# Altium footprint library 集大电协1.5.PcbLib: 283 footprints (part 6 of 18)
Each footprint in its own frame and in the unit in brackets; x right, y up, seen from the top. Pads: shape width x height; smd on the part's side, far side on the other; paste and mask are expansions set on the pad; w line width, h text height; cw(c..) or ccw(c..) is an arc to the next point about the centre after c.
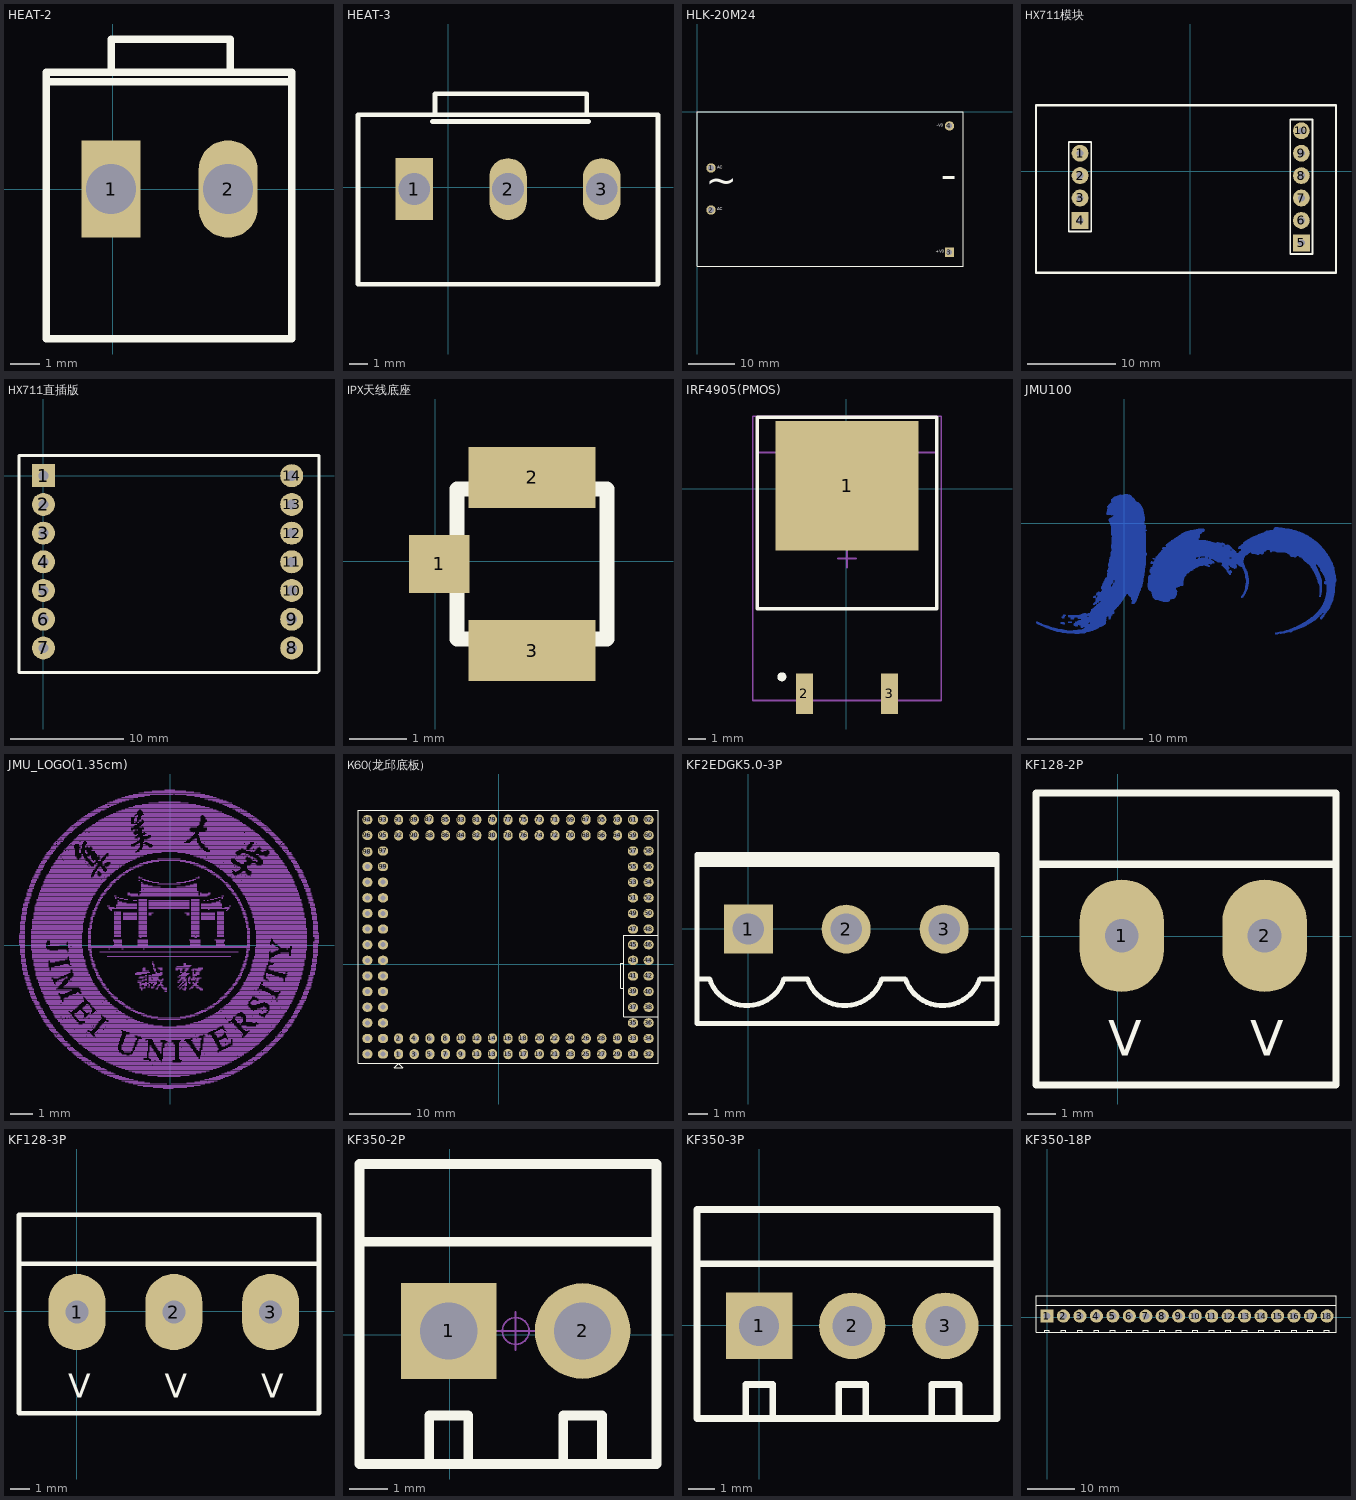
[diagram p5: the footprints below, top view; thin cyan lines are the x and y axes]

## HEAT-2 [mm]
pads (2):
  rect 2x3.3 hole 1.7: 1(-0.051,0.007)
  oval 2x3.3 hole 1.7: 2(3.909,0.007)
Top Overlay:
  lines w0.254: -2.251,3.639 6.069,3.639 ; -0.051,3.967 -0.051,5.087 3.988,5.087 3.988,3.967 ; -2.251,-5.073 -2.251,3.967 6.069,3.967 6.069,-5.073 -2.251,-5.073
3D body "molex-22-27-2021.STEP": height 11.68, standoff -3.56, extent -0.47,-3.57 4.61,2.78

## HEAT-3 [mm]
pads (3):
  rect 2x3.3 hole 1.7: 1(-1.8,-0.1)
  oval 2x3.3 hole 1.7: 2(3.2,-0.1) 3(8.2,-0.1)
Top Overlay:
  lines w0.254: -0.82,3.5 7.5,3.5 ; -0.7,3.867 -0.7,4.987 2.359,4.987 4.378,4.987 7.4,4.987 7.4,3.867 ; -4.8,-5.173 11.2,-5.173 11.2,3.867 -4.8,3.867 -4.8,-5.173
3D body "molex-22-27-2031.STEP": height 11.68, standoff -3.56, extent -0.457,-3.734 7.163,2.616

## HLK-20M24 [mm] "HILINK 24V隔离电源模块"
pads (4):
  round 2 hole 1.2: 1(3,-12) 2(3,-21) 4(54,-3)
  rect 2x2 hole 1.2: 3(54,-30)
Top Overlay:
  lines w0.1: 0,-33 0,0 57,0 57,-33 0,-33
  text "-V0" at 51.317,-3.4 h1.02
  text "+V0" at 51.075,-30.4 h1.02
  text "AC" at 4.375,-21.275 h1.02
  text "AC" at 4.375,-12.35 h1.02
  text "~" at 1.925,-19.35 h10
  text "-" at 52.175,-18.856 h12
3D body "20M4_3.step": height 22.6, standoff -6, extent 0,-33 57,0

## HX711模块 [mil]
pads (10):
  round 75 hole 30: 1(-492.49,81.19) 2(-492.49,-18.81) 3(-492.49,-118.81) 6(495.26,-219) 7(495.26,-119) 8(495.26,-19) 9(495.26,81) 10(495.26,181)
  rect 75x75 hole 30: 4(-492.49,-218.81) 5(495.26,-319)
Top Overlay:
  lines w7.87: -542.49,-268.81 -542.49,131.19 -442.49,131.19 -442.49,-268.81 -542.49,-268.81 ; 445.26,-369 445.26,231 545.26,231 545.26,-369 445.26,-369
  lines w10: -688.98,-452.76 -688.98,295.28 649.61,295.28 649.61,-452.76 -688.98,-452.76
3D body: height 340, standoff 300, extent -669.29,-433.07 629.92,275.59
3D body: height 336.22, standoff -118.11, extent -540.94,-262.99 -440.94,137.01
3D body: height 336.22, standoff -118.11, extent 445.26,-368.99 545.26,231.01

## HX711直插版 [mil]
pads (14):
  rect 80x80 hole 35.43: 1(0,0)
  round 80 hole 35.43: 2(0,-100) 3(0,-200) 4(0,-300) 5(0,-400) 6(0,-500) 7(0,-600) 8(865,-600) 9(865,-500) 10(865,-400) 11(865,-300) 12(865,-200) 13(865,-100) 14(865,0)
Top Overlay:
  lines w10: -85,-685 955,-685 960,-680 960,70 -85,70 -85,-685
Bottom Overlay:
  lines w7.87: -50,-650 -50,50 50,50 50,-650 -50,-650 ; 815,-650 915,-650 915,50 815,50 815,-650

## IPX天线底座 [mm]
pads (3):
  rect 1.05x1 smd: 1(0.073,-0.048)
  rect 2.2x1.05 smd: 2(1.681,1.452) 3(1.681,-1.548)
Top Overlay:
  lines w0.254: 0.381,-1.348 0.381,1.252 2.981,1.252 2.981,-1.348 0.381,-1.348
3D body "User Library-1909763-1.STEP": height 1.3, standoff 0.02, extent 0.149,-1.574 2.999,1.426

## IRF4905(PMOS) [mm] "IRF4905"
pads (3):
  rect 8x7.2 smd: 1(0.047,0.174)
  rect 0.95x2.25 smd: 2(-2.333,-11.426) 3(2.427,-11.426)
Top Overlay:
  circle w0.25: c-3.585,-10.478 r0.125
  lines w0.2: -4.953,-6.676 -4.953,3.998 5.047,3.998 5.047,-6.676 -4.953,-6.676
Mechanical 13:
  lines w0.1: -4.953,-6.676 5.047,-6.676 5.047,2.024 -4.953,2.024 -4.953,-6.676
Mechanical 15:
  lines w0.1: -0.453,-3.876 0.547,-3.876 ; 0.047,-4.376 0.047,-3.376 ; -5.203,-11.801 5.297,-11.801 5.297,4.049 -5.203,4.049 -5.203,-11.801
3D body "User Library-DPAK-1.STEP": height 2.39, standoff -0.02, extent -3.323,-10.459 3.217,-0.52

## JMU100 [mm]
Bottom Layer:
  lines w0.043: -7.654,-8.545 -7.395,-8.545 ; -7.654,-8.502 -7.481,-8.502 ; -7.611,-8.588 -7.309,-8.588 ; -7.525,-8.631 -7.179,-8.631 ; -7.481,-8.675 -7.136,-8.675 ; -7.395,-8.718 -7.05,-8.718 ; -7.266,-8.761 -6.92,-8.761 ; -7.179,-8.804 -6.747,-8.804 ; -7.05,-8.847 -6.575,-8.847 ; -6.963,-8.89 -6.488,-8.89 ; -6.877,-8.934 -6.402,-8.934 ; -6.791,-8.977 -6.272,-8.977 ; -6.704,-9.02 -6.056,-9.02 ; -6.531,-9.063 -5.884,-9.063 ; -6.445,-9.106 -5.754,-9.106 ; -6.359,-9.15 -5.366,-9.15 ; -6.186,-9.193 -5.193,-9.193 ; -6.1,-9.236 -4.977,-9.236 ; -5.927,-9.279 -2.904,-9.279 ; -5.841,-9.322 -3.034,-9.322 ; -5.495,-9.365 -3.293,-9.365 ; -5.495,-8.631 -5.15,-8.631 ; -5.495,-8.588 -5.15,-8.588 ; -5.495,-8.545 -5.236,-8.545 ; -5.409,-8.113 -5.193,-8.113 ; -5.409,-8.07 -5.193,-8.07 ; -5.366,-9.409 -3.336,-9.409 ; -5.366,-8.156 -5.193,-8.156 ; -5.322,-8.675 -5.15,-8.675 ; -5.322,-8.027 -5.15,-8.027 ; -5.322,-7.984 -5.15,-7.984 ; -5.279,-7.94 -5.063,-7.94 ; -5.279,-7.897 -5.107,-7.897 ; -4.977,-9.452 -3.422,-9.452 ; -4.847,-8.545 -4.545,-8.545 ; -4.847,-8.502 -4.545,-8.502 ; -4.847,-8.027 -3.207,-8.027 ; -4.847,-7.984 -3.207,-7.984 ; -4.847,-7.94 -1.134,-7.94 ; -4.804,-8.07 -3.207,-8.07 ; -4.632,-8.243 -4.372,-8.243 ; -4.632,-8.2 -4.372,-8.2 ; -4.632,-8.156 -4.329,-8.156 ; -4.632,-8.113 -4.329,-8.113 ; -4.416,-9.236 -2.732,-9.236 ; -4.372,-8.761 -4.027,-8.761 ; -4.372,-8.718 -1.695,-8.718 ; -4.372,-8.675 -3.12,-8.675 ; -4.329,-8.804 -4.027,-8.804 ; -4.329,-8.631 -3.12,-8.631 ; -4.286,-9.495 -3.897,-9.495 ; -4.243,-8.847 -4.027,-8.847 ; -4.243,-8.588 -3.12,-8.588 ; -4.243,-8.545 -3.077,-8.545 ; -4.243,-8.502 -1.609,-8.502 ; -4.07,-8.459 -1.609,-8.459 ; -4.027,-9.193 -2.645,-9.193 ; -4.027,-8.415 -1.609,-8.415 ; -4.027,-8.156 -1.566,-8.156 ; -4.027,-8.113 -1.566,-8.113 ; -3.984,-8.2 -1.566,-8.2 ; -3.941,-8.372 -1.566,-8.372 ; -3.897,-8.761 -1.782,-8.761 ; -3.854,-7.897 -1.048,-7.897 ; -3.768,-8.934 -3.552,-8.934 ; -3.768,-8.89 -1.998,-8.89 ; -3.768,-8.847 -1.911,-8.847 ; -3.768,-8.804 -1.825,-8.804 ; -3.725,-8.977 -3.595,-8.977 ; -3.725,-8.329 -1.566,-8.329 ; -3.725,-8.286 -1.609,-8.286 ; -3.725,-8.243 -1.609,-8.243 ; -3.725,-7.854 -1.048,-7.854 ; -3.638,-9.15 -2.516,-9.15 ; -3.638,-7.811 -1.048,-7.811 ; -3.552,-9.106 -2.429,-9.106 ; -3.509,-7.768 -3.336,-7.768 ; -3.466,-9.063 -2.343,-9.063 ; -3.422,-9.02 -2.257,-9.02 ; -3.422,-8.977 -2.213,-8.977 ; -3.422,-8.934 -2.17,-8.934 ; -3.12,-7.768 -0.918,-7.768 ; -3.077,-8.07 -1.566,-8.07 ; -3.077,-8.027 -1.523,-8.027 ; -3.077,-7.984 -1.134,-7.984 ; -2.991,-8.675 -1.652,-8.675 ; -2.948,-8.631 -1.609,-8.631 ; -2.948,-8.588 -1.609,-8.588 ; -2.948,-8.545 -1.609,-8.545 ; -2.948,-7.725 -0.875,-7.725 ; -2.948,-7.681 -0.875,-7.681 ; -2.904,-7.638 -0.875,-7.638 ; -2.904,-7.595 -0.918,-7.595 ; -2.861,-7.552 -0.918,-7.552 ; -2.861,-7.509 -0.918,-7.509 ; -2.861,-7.465 -0.875,-7.465 ; -2.861,-7.422 -0.832,-7.422 ; -2.775,-7.379 -0.789,-7.379 ; -2.688,-7.336 -0.745,-7.336 ; -2.688,-6.991 -2.559,-6.991 ; -2.688,-6.947 -2.516,-6.947 ; -2.688,-6.386 -2.473,-6.386 ; -2.688,-6.343 -2.473,-6.343 ; -2.645,-7.293 -0.702,-7.293 ; -2.645,-6.904 -2.386,-6.904 ; -2.645,-6.3 -2.473,-6.3 ; -2.602,-7.25 -0.659,-7.25 ; -2.602,-6.861 -2.386,-6.861 ; -2.559,-7.206 -0.659,-7.206 ; -2.559,-6.818 -2.343,-6.818 ; -2.559,-6.256 -2.473,-6.256 ; -2.516,-7.163 -0.573,-7.163 ; -2.516,-6.775 -2.213,-6.775 ; -2.473,-6.731 -2.213,-6.731 ; -2.473,-6.688 -2.17,-6.688 ; -2.473,-6.645 -0.184,-6.645 ; -2.473,-6.602 -0.141,-6.602 ; -2.473,-6.559 -0.141,-6.559 ; -2.473,-6.516 -0.098,-6.516 ; -2.473,-6.472 -0.098,-6.472 ; -2.473,-6.429 -0.054,-6.429 ; -2.429,-7.12 -0.529,-7.12 ; -2.429,-7.077 -0.486,-7.077 ; -2.429,-6.17 0.118,-6.17 ; -2.429,-6.127 0.161,-6.127 ; -2.429,-6.084 0.161,-6.084 ; -2.386,-7.034 -0.486,-7.034 ; -2.386,-6.991 -0.443,-6.991 ; -2.386,-6.041 1.241,-6.041 ; -2.386,-5.997 1.284,-5.997 ; -2.343,-6.386 -0.011,-6.386 ; -2.343,-6.343 -0.011,-6.343 ; -2.3,-6.3 0.032,-6.3 ; -2.3,-6.256 0.075,-6.256 ; -2.3,-6.213 0.118,-6.213 ; -2.3,-5.954 1.284,-5.954 ; -2.257,-6.947 -0.4,-6.947 ; -2.257,-5.911 -2.17,-5.911 ; -2.213,-6.904 -0.357,-6.904 ; -2.213,-6.861 -0.314,-6.861 ; -2.084,-6.818 -0.314,-6.818 ; -2.041,-6.775 -0.27,-6.775 ; -2.041,-6.731 -0.227,-6.731 ; -2.041,-6.688 -0.227,-6.688 ; -1.998,-5.911 1.327,-5.911 ; -1.998,-5.868 1.327,-5.868 ; -1.998,-5.609 1.414,-5.609 ; -1.998,-5.566 1.414,-5.566 ; -1.998,-5.522 1.457,-5.522 ; -1.998,-5.479 1.5,-5.479 ; -1.954,-5.825 1.327,-5.825 ; -1.954,-5.652 1.414,-5.652 ; -1.954,-5.436 -1.177,-5.436 ; -1.911,-5.781 1.37,-5.781 ; -1.911,-5.738 1.414,-5.738 ; -1.911,-5.695 1.414,-5.695 ; -1.911,-5.393 -1.177,-5.393 ; -1.911,-5.35 -1.177,-5.35 ; -1.911,-5.306 -1.177,-5.306 ; -1.868,-5.263 -1.134,-5.263 ; -1.868,-5.22 -1.134,-5.22 ; -1.868,-5.177 -1.091,-5.177 ; -1.825,-5.134 -0.961,-5.134 ; -1.782,-5.091 -0.961,-5.091 ; -1.782,-5.047 -0.961,-5.047 ; -1.782,-5.004 -0.961,-5.004 ; -1.738,-4.961 -0.961,-4.961 ; -1.695,-4.918 -0.961,-4.918 ; -1.695,-4.875 -0.961,-4.875 ; -1.695,-4.832 1.63,-4.832 ; -1.652,-4.788 1.63,-4.788 ; -1.652,-4.745 1.63,-4.745 ; -1.609,-4.702 1.63,-4.702 ; -1.566,0.825 1.673,0.825 ; -1.523,-4.659 1.673,-4.659 ; -1.523,0.868 1.673,0.868 ; -1.523,0.911 1.673,0.911 ; -1.523,0.955 1.673,0.955 ; -1.523,0.998 1.673,0.998 ; -1.479,-4.616 1.673,-4.616 ; -1.479,-4.572 1.673,-4.572 ; -1.479,-4.529 1.673,-4.529 ; -1.479,-4.486 1.716,-4.486 ; -1.479,-4.443 1.716,-4.443 ; -1.479,-4.4 1.716,-4.4 ; -1.479,-4.357 1.716,-4.357 ; -1.479,-4.313 1.716,-4.313 ; -1.479,-4.141 1.759,-4.141 ; -1.479,-4.097 1.759,-4.097 ; -1.479,-4.054 1.759,-4.054 ; -1.479,0.782 1.716,0.782 ; -1.479,1.041 1.63,1.041 ; -1.479,1.084 1.63,1.084 ; -1.479,1.127 1.63,1.127 ; -1.479,1.171 1.63,1.171 ; -1.479,1.214 1.63,1.214 ; -1.479,1.43 1.5,1.43 ; -1.479,1.473 1.5,1.473 ; -1.436,-4.27 1.716,-4.27 ; -1.436,-4.227 1.716,-4.227 ; -1.436,-4.184 1.759,-4.184 ; -1.436,-4.011 1.759,-4.011 ; -1.436,1.257 1.586,1.257 ; -1.436,1.3 1.586,1.3 ; -1.436,1.343 1.543,1.343 ; -1.436,1.386 1.543,1.386 ; -1.393,-3.968 1.759,-3.968 ; -1.393,-3.925 1.759,-3.925 ; -1.393,-3.882 1.759,-3.882 ; -1.393,-3.666 1.802,-3.666 ; -1.393,-3.622 1.802,-3.622 ; -1.393,-3.579 1.845,-3.579 ; -1.393,-3.536 1.845,-3.536 ; -1.393,-3.493 1.845,-3.493 ; -1.393,1.516 1.457,1.516 ; -1.393,1.559 1.414,1.559 ; -1.35,-8.243 -1.22,-8.243 ; -1.35,-8.2 -1.22,-8.2 ; -1.35,-8.156 -1.177,-8.156 ; -1.35,-8.113 -1.177,-8.113 ; -1.35,-8.07 -1.177,-8.07 ; -1.35,-8.027 -1.177,-8.027 ; -1.35,-3.838 1.759,-3.838 ; -1.35,-3.795 1.802,-3.795 ; -1.35,-3.752 1.802,-3.752 ; -1.35,-3.709 1.802,-3.709 ; -1.35,-3.45 1.845,-3.45 ; -1.35,-3.407 1.845,-3.407 ; -1.35,0.264 1.759,0.264 ; -1.35,0.307 1.759,0.307 ; -1.35,0.35 1.759,0.35 ; -1.35,1.602 1.414,1.602 ; -1.307,-3.363 1.845,-3.363 ; -1.307,-3.32 1.845,-3.32 ; -1.307,-3.277 1.845,-3.277 ; -1.307,-3.234 1.845,-3.234 ; -1.307,-3.191 1.845,-3.191 ; -1.307,-3.147 1.845,-3.147 ; -1.307,-3.104 1.845,-3.104 ; -1.307,0.177 1.716,0.177 ; -1.307,0.221 1.716,0.221 ; -1.307,0.393 1.759,0.393 ; -1.307,1.645 1.37,1.645 ; -1.263,-3.061 1.845,-3.061 ; -1.263,-3.018 1.845,-3.018 ; -1.263,-2.975 1.845,-2.975 ; -1.263,-2.932 1.845,-2.932 ; -1.263,0.091 1.716,0.091 ; -1.263,0.134 1.716,0.134 ; -1.263,0.436 1.759,0.436 ; -1.263,1.689 1.327,1.689 ; -1.22,-2.888 1.845,-2.888 ; -1.22,-0.039 1.716,-0.039 ; -1.22,0.005 1.716,0.005 ; -1.22,0.048 1.716,0.048 ; -1.22,1.732 1.284,1.732 ; -1.177,-2.845 1.845,-2.845 ; -1.177,-2.802 1.845,-2.802 ; -1.177,-2.759 1.889,-2.759 ; -1.177,-2.716 1.889,-2.716 ; -1.177,-2.673 1.932,-2.673 ; -1.177,-2.629 1.932,-2.629 ; -1.177,-2.586 1.932,-2.586 ; -1.177,-2.543 1.889,-2.543 ; -1.177,-2.5 1.845,-2.5 ; -1.177,-0.168 1.845,-0.168 ; -1.177,-0.125 1.802,-0.125 ; -1.177,-0.082 1.716,-0.082 ; -1.177,0.48 1.759,0.48 ; -1.177,1.775 1.241,1.775 ; -1.134,-2.457 1.845,-2.457 ; -1.134,-2.413 1.845,-2.413 ; -1.134,-2.111 1.845,-2.111 ; -1.134,-2.068 1.845,-2.068 ; -1.134,-2.025 1.845,-2.025 ; -1.134,-1.982 1.845,-1.982 ; -1.134,-1.938 1.845,-1.938 ; -1.134,-1.895 1.845,-1.895 ; -1.134,-1.852 1.845,-1.852 ; -1.134,-0.945 1.845,-0.945 ; -1.134,-0.902 1.845,-0.902 ; -1.134,-0.859 1.845,-0.859 ; -1.134,-0.816 1.845,-0.816 ; -1.134,-0.773 1.802,-0.773 ; -1.134,-0.729 1.802,-0.729 ; -1.134,-0.686 1.802,-0.686 ; -1.134,-0.643 1.845,-0.643 ; -1.134,-0.6 1.932,-0.6 ; -1.134,-0.557 1.889,-0.557 ; -1.134,-0.514 1.802,-0.514 ; -1.134,-0.47 1.802,-0.47 ; -1.134,-0.427 1.802,-0.427 ; -1.134,-0.384 1.845,-0.384 ; -1.134,-0.341 1.845,-0.341 ; -1.134,-0.298 1.845,-0.298 ; -1.134,-0.254 1.845,-0.254 ; -1.134,-0.211 1.845,-0.211 ; -1.134,0.739 -1.048,0.739 ; -1.134,1.905 0.982,1.905 ; -1.134,1.948 0.982,1.948 ; -1.134,1.991 0.896,1.991 ; -1.134,2.034 0.896,2.034 ; -1.134,2.077 0.896,2.077 ; -1.091,-2.37 1.845,-2.37 ; -1.091,-2.327 1.845,-2.327 ; -1.091,-2.284 1.845,-2.284 ; -1.091,-2.241 1.845,-2.241 ; -1.091,-2.198 1.845,-2.198 ; -1.091,-2.154 1.845,-2.154 ; -1.091,-1.809 1.845,-1.809 ; -1.091,-1.766 1.845,-1.766 ; -1.091,-1.723 1.845,-1.723 ; -1.091,-1.679 1.845,-1.679 ; -1.091,-1.636 1.845,-1.636 ; -1.091,-1.593 1.845,-1.593 ; -1.091,-1.55 1.845,-1.55 ; -1.091,-1.507 1.845,-1.507 ; -1.091,-1.463 1.845,-1.463 ; -1.091,-1.42 1.845,-1.42 ; -1.091,-1.377 1.845,-1.377 ; -1.091,-1.334 1.845,-1.334 ; -1.091,-1.291 1.845,-1.291 ; -1.091,-1.248 1.845,-1.248 ; -1.091,-1.204 1.845,-1.204 ; -1.091,-1.032 1.845,-1.032 ; -1.091,-0.988 1.845,-0.988 ; -1.091,0.523 1.759,0.523 ; -1.091,1.818 1.198,1.818 ; -1.091,1.861 1.068,1.861 ; -1.048,-5.436 1.5,-5.436 ; -1.048,-5.393 1.543,-5.393 ; -1.048,-1.161 1.845,-1.161 ; -1.048,-1.118 1.845,-1.118 ; -1.048,-1.075 1.845,-1.075 ; -1.048,0.566 1.759,0.566 ; -1.048,2.12 0.852,2.12 ; -1.004,-5.35 1.543,-5.35 ; -1.004,-5.306 1.543,-5.306 ; -1.004,2.164 0.809,2.164 ; -0.961,-5.263 1.543,-5.263 ; -0.961,-5.22 1.543,-5.22 ; -0.961,-5.177 1.586,-5.177 ; -0.961,0.609 1.716,0.609 ; -0.961,0.739 1.716,0.739 ; -0.961,2.207 0.766,2.207 ; -0.918,0.652 1.716,0.652 ; -0.918,0.696 1.716,0.696 ; -0.918,2.25 0.68,2.25 ; -0.875,-5.134 1.586,-5.134 ; -0.875,2.293 0.636,2.293 ; -0.832,-5.091 1.586,-5.091 ; -0.832,-5.047 1.586,-5.047 ; -0.832,-5.004 1.63,-5.004 ; -0.832,-4.961 1.63,-4.961 ; -0.832,-4.918 1.63,-4.918 ; -0.832,-4.875 1.63,-4.875 ; -0.745,2.336 0.636,2.336 ; -0.616,2.38 0.593,2.38 ; -0.486,2.423 0.55,2.423 ; -0.4,2.466 -0.27,2.466 ; -0.141,2.466 0.464,2.466 ; 0.032,2.509 0.291,2.509 ; 0.334,-6.127 1.241,-6.127 ; 0.334,-6.084 1.241,-6.084 ; 0.377,-6.213 1.198,-6.213 ; 0.377,-6.17 1.241,-6.17 ; 0.464,-6.3 1.155,-6.3 ; 0.464,-6.256 1.155,-6.256 ; 0.55,-6.343 1.155,-6.343 ; 0.593,-6.559 1.068,-6.559 ; 0.593,-6.516 1.068,-6.516 ; 0.593,-6.472 1.111,-6.472 ; 0.593,-6.429 1.111,-6.429 ; 0.593,-6.386 1.155,-6.386 ; 0.636,-6.904 0.852,-6.904 ; 0.636,-6.861 0.896,-6.861 ; 0.636,-6.818 0.939,-6.818 ; 0.636,-6.775 0.939,-6.775 ; 0.68,-6.731 0.982,-6.731 ; 0.68,-6.688 1.025,-6.688 ; 0.68,-6.645 1.025,-6.645 ; 0.68,-6.602 1.068,-6.602 ; 2.018,-5.479 4.609,-5.479 ; 2.018,-5.436 4.739,-5.436 ; 2.018,-5.393 4.782,-5.393 ; 2.018,-5.35 5.041,-5.35 ; 2.018,-5.306 5.084,-5.306 ; 2.018,-5.263 5.084,-5.263 ; 2.018,-5.22 5.084,-5.22 ; 2.018,-5.177 5.084,-5.177 ; 2.061,-5.652 4.436,-5.652 ; 2.061,-5.609 4.436,-5.609 ; 2.061,-5.566 4.436,-5.566 ; 2.061,-5.522 4.479,-5.522 ; 2.061,-5.134 5.084,-5.134 ; 2.061,-5.091 5.084,-5.091 ; 2.061,-5.047 5.084,-5.047 ; 2.061,-5.004 5.084,-5.004 ; 2.061,-4.961 5.084,-4.961 ; 2.061,-4.918 5.084,-4.918 ; 2.061,-4.875 5.127,-4.875 ; 2.061,-4.832 5.127,-4.832 ; 2.061,-4.788 5.127,-4.788 ; 2.061,-4.745 5.127,-4.745 ; 2.061,-4.702 5.17,-4.702 ; 2.061,-4.659 5.17,-4.659 ; 2.061,-4.616 5.17,-4.616 ; 2.105,-5.695 4.436,-5.695 ; 2.105,-4.572 5.214,-4.572 ; 2.105,-4.529 5.257,-4.529 ; 2.148,-5.738 4.479,-5.738 ; 2.148,-4.486 5.3,-4.486 ; 2.191,-5.781 4.523,-5.781 ; 2.191,-4.184 5.602,-4.184 ; 2.191,-4.141 5.645,-4.141 ; 2.191,-4.097 5.688,-4.097 ; 2.191,-4.054 5.818,-4.054 ; 2.191,-4.011 5.948,-4.011 ; 2.234,-4.227 5.559,-4.227 ; 2.234,-3.968 5.948,-3.968 ; 2.277,-5.825 4.523,-5.825 ; 2.277,-4.443 5.343,-4.443 ; 2.277,-4.4 5.343,-4.4 ; 2.277,-4.357 5.343,-4.357 ; 2.277,-4.313 5.386,-4.313 ; 2.277,-4.27 5.516,-4.27 ; 2.277,-3.925 5.948,-3.925 ; 2.277,-3.882 6.077,-3.882 ; 2.277,-3.838 6.12,-3.838 ; 2.277,-3.795 6.207,-3.795 ; 2.277,-3.45 7.545,-3.45 ; 2.277,-3.407 7.761,-3.407 ; 2.277,-3.363 7.761,-3.363 ; 2.32,-5.868 4.566,-5.868 ; 2.32,-3.32 7.718,-3.32 ; 2.32,-3.277 2.364,-3.277 ; 2.364,-6.041 4.523,-6.041 ; 2.364,-5.997 4.523,-5.997 ; 2.364,-5.954 4.523,-5.954 ; 2.364,-5.911 4.523,-5.911 ; 2.407,-6.213 4.479,-6.213 ; 2.407,-6.17 4.479,-6.17 ; 2.407,-6.127 4.523,-6.127 ; 2.407,-6.084 4.523,-6.084 ; 2.407,-3.752 6.336,-3.752 ; 2.45,-6.343 4.436,-6.343 ; 2.45,-6.3 4.436,-6.3 ; 2.45,-6.256 4.436,-6.256 ; 2.45,-3.709 6.379,-3.709 ; 2.45,-3.666 6.466,-3.666 ; 2.45,-3.622 6.768,-3.622 ; 2.45,-3.018 2.58,-3.018 ; 2.493,-6.386 4.35,-6.386 ; 2.493,-3.579 7.243,-3.579 ; 2.493,-3.536 7.243,-3.536 ; 2.493,-3.493 7.243,-3.493 ; 2.493,-3.061 6.163,-3.061 ; 2.536,-6.429 4.35,-6.429 ; 2.58,-6.472 4.264,-6.472 ; 2.58,-3.277 7.718,-3.277 ; 2.58,-3.234 7.632,-3.234 ; 2.623,-6.516 4.048,-6.516 ; 2.623,-3.191 7.545,-3.191 ; 2.623,-3.147 7.502,-3.147 ; 2.623,-3.104 7.459,-3.104 ; 2.666,-6.559 3.918,-6.559 ; 2.709,-3.018 6.163,-3.018 ; 2.709,-2.975 6.163,-2.975 ; 2.709,-2.932 6.163,-2.932 ; 2.709,-2.888 6.293,-2.888 ; 2.795,-2.845 6.552,-2.845 ; 2.839,-2.802 10.395,-2.802 ; 2.882,-2.759 10.438,-2.759 ; 2.925,-2.716 10.525,-2.716 ; 2.925,-2.673 10.611,-2.673 ; 2.968,-6.602 3.918,-6.602 ; 2.968,-2.629 10.654,-2.629 ; 3.011,-2.586 10.697,-2.586 ; 3.055,-6.645 3.918,-6.645 ; 3.055,-2.543 9.661,-2.543 ; 3.098,-2.5 9.661,-2.5 ; 3.141,-2.457 9.661,-2.457 ; 3.184,-2.413 9.618,-2.413 ; 3.184,-2.37 9.532,-2.37 ; 3.227,-6.688 3.875,-6.688 ; 3.227,-2.327 9.143,-2.327 ; 3.27,-2.154 9.272,-2.154 ; 3.27,-2.111 9.272,-2.111 ; 3.314,-2.284 9.143,-2.284 ; 3.314,-2.241 9.143,-2.241 ; 3.314,-2.198 9.359,-2.198 ; 3.357,-6.731 3.789,-6.731 ; 3.357,-2.068 9.229,-2.068 ; 3.573,-1.895 8.452,-1.895 ; 3.616,-2.025 9.186,-2.025 ; 3.616,-1.982 8.452,-1.982 ; 3.616,-1.938 8.452,-1.938 ; 3.616,-1.852 8.711,-1.852 ; 3.616,-1.809 8.668,-1.809 ; 3.702,-1.766 8.668,-1.766 ; 3.745,-1.723 8.582,-1.723 ; 3.789,-1.679 7.847,-1.679 ; 3.875,-1.636 7.675,-1.636 ; 3.918,-1.593 7.502,-1.593 ; 4.004,-1.55 7.416,-1.55 ; 4.048,-1.507 7.2,-1.507 ; 4.048,-1.463 7.027,-1.463 ; 4.177,-1.42 6.423,-1.42 ; 4.264,-1.377 6.379,-1.377 ; 4.307,-1.334 6.379,-1.334 ; 4.35,-1.291 6.379,-1.291 ; 4.436,-1.248 6.466,-1.248 ; 4.479,-1.204 6.466,-1.204 ; 4.566,-1.161 6.509,-1.161 ; 4.652,-1.118 6.509,-1.118 ; 4.695,-1.075 6.509,-1.075 ; 4.739,-1.032 6.509,-1.032 ; 4.868,-0.988 6.509,-0.988 ; 4.868,-0.945 6.509,-0.945 ; 4.911,-0.902 6.509,-0.902 ; 4.998,-0.859 6.638,-0.859 ; 5.084,-0.816 6.638,-0.816 ; 5.17,-0.773 6.682,-0.773 ; 5.257,-0.729 6.725,-0.729 ; 5.386,-0.686 6.854,-0.686 ; 5.559,-0.643 6.898,-0.643 ; 5.688,-0.6 6.898,-0.6 ; 5.991,-0.557 6.941,-0.557 ; 6.207,-0.514 6.898,-0.514 ; 6.336,-3.061 7.459,-3.061 ; 6.379,-3.018 7.2,-3.018 ; 6.379,-0.47 6.854,-0.47 ; 6.423,-2.975 6.509,-2.975 ; 6.423,-2.932 6.509,-2.932 ; 6.423,-2.888 6.509,-2.888 ; 6.638,-2.975 7.2,-2.975 ; 6.984,-3.622 7.329,-3.622 ; 6.984,-2.932 7.2,-2.932 ; 6.984,-2.888 10.352,-2.888 ; 6.984,-2.845 10.395,-2.845 ; 7.113,-3.666 7.373,-3.666 ; 7.243,-3.709 7.373,-3.709 ; 7.329,-3.018 9.057,-3.018 ; 7.329,-2.975 9.057,-2.975 ; 7.329,-2.932 9.057,-2.932 ; 7.416,-3.493 7.502,-3.493 ; 7.632,-3.061 10.309,-3.061 ; 7.718,-3.104 10.309,-3.104 ; 7.761,-3.147 10.266,-3.147 ; 7.847,-3.191 10.266,-3.191 ; 7.934,-3.234 10.266,-3.234 ; 7.977,-1.679 8.279,-1.679 ; 7.977,-1.636 8.107,-1.636 ; 8.02,-3.277 10.266,-3.277 ; 8.063,-3.32 10.266,-3.32 ; 8.409,-3.622 8.97,-3.622 ; 8.409,-3.579 9.661,-3.579 ; 8.409,-3.363 10.266,-3.363 ; 8.409,-1.679 8.495,-1.679 ; 8.452,-3.536 9.661,-3.536 ; 8.452,-3.493 9.661,-3.493 ; 8.452,-3.45 10.309,-3.45 ; 8.452,-3.407 10.266,-3.407 ; 8.495,-3.666 8.97,-3.666 ; 8.538,-3.709 8.97,-3.709 ; 8.582,-3.752 9.013,-3.752 ; 8.582,-1.982 9.143,-1.982 ; 8.582,-1.938 9.1,-1.938 ; 8.582,-1.895 9.057,-1.895 ; 8.625,-3.795 9.057,-3.795 ; 8.668,-3.838 9.057,-3.838 ; 8.711,-3.882 9.057,-3.882 ; 8.754,-3.925 9.013,-3.925 ; 8.797,-3.968 8.97,-3.968 ; 8.841,-4.097 9.229,-4.097 ; 8.841,-4.054 8.97,-4.054 ; 8.841,-4.011 8.97,-4.011 ; 8.841,-1.852 8.97,-1.852 ; 8.884,-4.141 9.272,-4.141 ; 8.927,-4.227 9.272,-4.227 ; 8.927,-4.184 9.272,-4.184 ; 8.97,-4.27 9.186,-4.27 ; 9.013,-4.313 9.186,-4.313 ; 9.057,-4.4 9.186,-4.4 ; 9.057,-4.357 9.186,-4.357 ; 9.1,-3.622 9.661,-3.622 ; 9.143,-4.054 9.186,-4.054 ; 9.143,-3.709 9.704,-3.709 ; 9.143,-3.666 9.704,-3.666 ; 9.229,-3.752 9.704,-3.752 ; 9.272,-3.018 10.309,-3.018 ; 9.272,-2.975 10.309,-2.975 ; 9.272,-2.932 10.352,-2.932 ; 9.272,-2.327 9.532,-2.327 ; 9.272,-2.284 9.445,-2.284 ; 9.272,-2.241 9.402,-2.241 ; 9.316,-3.795 9.661,-3.795 ; 9.445,-3.838 9.661,-3.838 ; 9.488,-3.882 9.532,-3.882 ; 9.791,-3.536 10.309,-3.536 ; 9.791,-3.493 10.309,-3.493 ; 9.834,-3.579 10.352,-3.579 ; 9.834,-2.543 10.741,-2.543 ; 9.834,-2.154 17.131,-2.154 ; 9.834,-2.111 17.088,-2.111 ; 9.877,-2.068 17.045,-2.068 ; 9.877,-2.025 17.045,-2.025 ; 9.92,-3.622 10.352,-3.622 ; 9.92,-2.5 10.827,-2.5 ; 9.92,-2.457 12.036,-2.457 ; 9.92,-1.982 17.002,-1.982 ; 9.963,-3.666 10.395,-3.666 ; 9.963,-2.413 12.079,-2.413 ; 10.05,-3.709 10.395,-3.709 ; 10.05,-2.37 12.209,-2.37 ; 10.05,-1.938 16.958,-1.938 ; 10.05,-1.895 16.915,-1.895 ; 10.093,-6.386 10.179,-6.386 ; 10.093,-6.343 10.266,-6.343 ; 10.093,-6.3 10.266,-6.3 ; 10.093,-2.327 12.252,-2.327 ; 10.093,-2.284 12.252,-2.284 ; 10.093,-2.241 17.218,-2.241 ; 10.093,-2.198 17.174,-2.198 ; 10.093,-1.852 16.872,-1.852 ; 10.136,-6.256 10.309,-6.256 ; 10.179,-6.213 10.352,-6.213 ; 10.179,-3.752 10.395,-3.752 ; 10.179,-1.809 16.829,-1.809 ; 10.222,-6.17 10.352,-6.17 ; 10.222,-6.127 10.395,-6.127 ; 10.222,-3.882 10.438,-3.882 ; 10.222,-3.838 10.438,-3.838 ; 10.222,-3.795 10.395,-3.795 ; 10.266,-6.084 10.395,-6.084 ; 10.266,-3.925 10.481,-3.925 ; 10.266,-1.766 16.786,-1.766 ; 10.266,-1.723 16.743,-1.723 ; 10.266,-1.679 16.699,-1.679 ; 10.309,-6.041 10.438,-6.041 ; 10.309,-5.997 10.481,-5.997 ; 10.309,-5.954 10.481,-5.954 ; 10.309,-4.054 10.525,-4.054 ; 10.309,-4.011 10.525,-4.011 ; 10.309,-3.968 10.525,-3.968 ; 10.309,-1.636 16.656,-1.636 ; 10.352,-5.911 10.481,-5.911 ; 10.352,-5.868 10.525,-5.868 ; 10.352,-4.184 10.611,-4.184 ; 10.352,-4.141 10.611,-4.141 ; 10.352,-4.097 10.568,-4.097 ; 10.352,-1.593 16.613,-1.593 ; 10.395,-5.825 10.525,-5.825 ; 10.395,-5.781 10.568,-5.781 ; 10.395,-5.738 10.568,-5.738 ; 10.395,-4.313 10.654,-4.313 ; 10.395,-4.27 10.654,-4.27 ; 10.395,-4.227 10.611,-4.227 ; 10.438,-5.695 10.611,-5.695 ; 10.438,-5.652 10.611,-5.652 ; 10.438,-5.609 10.654,-5.609 ; 10.438,-5.566 10.654,-5.566 ; 10.438,-5.522 10.654,-5.522 ; 10.438,-5.479 10.654,-5.479 ; 10.438,-5.436 10.654,-5.436 ; 10.438,-5.393 10.697,-5.393 ; 10.438,-4.659 10.697,-4.659 ; 10.438,-4.616 10.697,-4.616 ; 10.438,-4.572 10.697,-4.572 ; 10.438,-4.529 10.697,-4.529 ; 10.438,-4.486 10.654,-4.486 ; 10.438,-4.443 10.654,-4.443 ; 10.438,-4.4 10.654,-4.4 ; 10.438,-4.357 10.654,-4.357 ; 10.438,-1.55 16.527,-1.55 ; 10.481,-5.35 10.697,-5.35 ; 10.481,-5.306 10.697,-5.306 ; 10.481,-5.263 10.697,-5.263 ; 10.481,-5.22 10.697,-5.22 ; 10.481,-5.177 10.741,-5.177 ; 10.481,-4.788 10.741,-4.788 ; 10.481,-4.745 10.741,-4.745 ; 10.481,-4.702 10.697,-4.702 ; 10.481,-1.507 16.483,-1.507 ; 10.525,-5.134 10.741,-5.134 ; 10.525,-5.091 10.741,-5.091 ; 10.525,-5.047 10.741,-5.047 ; 10.525,-5.004 10.741,-5.004 ; 10.525,-4.961 10.741,-4.961 ; 10.525,-4.918 10.741,-4.918 ; 10.525,-4.875 10.741,-4.875 ; 10.525,-4.832 10.741,-4.832 ; 10.568,-1.463 16.397,-1.463 ; 10.611,-1.42 16.354,-1.42 ; 10.697,-1.377 16.311,-1.377 ; 10.784,-1.334 16.224,-1.334 ; 10.87,-1.291 16.181,-1.291 ; 10.913,-1.248 16.138,-1.248 ; 10.956,-2.543 12.036,-2.543 ; 10.956,-2.5 12.036,-2.5 ; 11,-1.204 16.052,-1.204 ; 11.043,-2.586 11.993,-2.586 ; 11.086,-1.161 15.965,-1.161 ; 11.172,-1.118 15.922,-1.118 ; 11.302,-1.075 15.879,-1.075 ; 11.345,-2.629 11.647,-2.629 ; 11.431,-1.032 15.793,-1.032 ; 11.475,-2.673 11.604,-2.673 ; 11.518,-0.988 15.706,-0.988 ; 11.561,-0.945 15.577,-0.945 ; 11.691,-0.902 15.534,-0.902 ; 11.82,-2.629 11.95,-2.629 ; 11.82,-0.859 15.447,-0.859 ; 11.95,-0.816 15.361,-0.816 ; 12.079,-0.773 15.231,-0.773 ; 12.122,-0.729 15.145,-0.729 ; 12.209,-0.686 14.972,-0.686 ; 12.252,-0.643 14.886,-0.643 ; 12.554,-2.284 17.261,-2.284 ; 12.554,-0.6 14.756,-0.6 ; 12.597,-2.413 12.727,-2.413 ; 12.597,-2.37 17.304,-2.37 ; 12.597,-2.327 17.304,-2.327 ; 12.64,-2.457 12.684,-2.457 ; 12.856,-0.557 14.54,-0.557 ; 12.9,-0.514 14.454,-0.514 ; 12.9,-0.47 14.238,-0.47 ; 12.943,-0.427 13.85,-0.427 ; 12.943,-0.384 13.634,-0.384 ; 13.029,-9.538 13.245,-9.538 ; 13.029,-9.495 13.331,-9.495 ; 13.029,-9.452 13.85,-9.452 ; 13.029,-0.341 13.288,-0.341 ; 13.072,-2.413 17.347,-2.413 ; 13.159,-2.457 17.39,-2.457 ; 13.245,-9.409 13.979,-9.409 ; 13.418,-9.365 14.152,-9.365 ; 13.461,-9.495 13.547,-9.495 ; 13.763,-9.322 14.454,-9.322 ; 13.85,-9.279 14.54,-9.279 ; 13.936,-2.5 17.39,-2.5 ; 13.979,-9.236 14.584,-9.236 ; 14.065,-2.543 17.433,-2.543 ; 14.109,-2.586 17.477,-2.586 ; 14.195,-9.193 14.756,-9.193 ; 14.195,-2.629 17.52,-2.629 ; 14.281,-9.365 14.411,-9.365 ; 14.281,-9.15 14.843,-9.15 ; 14.281,-2.716 17.563,-2.716 ; 14.281,-2.673 17.563,-2.673 ; 14.324,-2.802 14.886,-2.802 ; 14.324,-2.759 17.563,-2.759 ; 14.368,-9.106 14.972,-9.106 ; 14.411,-2.845 14.843,-2.845 ; 14.497,-9.063 15.102,-9.063 ; 14.584,-9.02 15.188,-9.02 ; 14.67,-8.977 15.318,-8.977 ; 14.67,-2.888 14.799,-2.888 ; 14.843,-8.934 15.447,-8.934 ; 14.886,-8.89 15.534,-8.89 ; 14.972,-8.847 15.62,-8.847 ; 15.059,-8.804 15.706,-8.804 ; 15.059,-2.802 17.606,-2.802 ; 15.102,-2.845 17.649,-2.845 ; 15.145,-8.761 15.749,-8.761 ; 15.145,-2.888 17.693,-2.888 ; 15.231,-8.718 15.793,-8.718 ; 15.318,-8.675 15.922,-8.675 ; 15.318,-2.975 17.736,-2.975 ; 15.318,-2.932 17.693,-2.932 ; 15.361,-8.631 15.965,-8.631 ; 15.404,-3.018 17.736,-3.018 ; 15.447,-8.588 16.052,-8.588 ; 15.447,-3.104 17.779,-3.104 ; 15.447,-3.061 17.779,-3.061 ; 15.49,-3.147 17.822,-3.147 ; 15.534,-8.545 16.138,-8.545 ; 15.534,-3.191 17.822,-3.191 ; 15.577,-3.234 17.865,-3.234 ; 15.62,-8.502 16.181,-8.502 ; 15.62,-3.277 17.865,-3.277 ; 15.706,-8.459 16.268,-8.459 ; 15.706,-3.32 17.908,-3.32 ; 15.749,-8.415 16.311,-8.415 ; 15.749,-3.363 17.952,-3.363 ; 15.793,-8.372 16.397,-8.372 ; 15.793,-3.407 17.952,-3.407 ; 15.836,-3.45 17.995,-3.45 ; 15.879,-8.329 16.483,-8.329 ; 15.922,-8.286 16.527,-8.286 ; 15.922,-3.493 17.995,-3.493 ; 15.965,-3.536 16.527,-3.536 ; 16.009,-8.243 16.57,-8.243 ; 16.009,-3.579 16.527,-3.579 ; 16.052,-8.2 16.613,-8.2 ; 16.052,-3.622 16.527,-3.622 ; 16.095,-8.156 16.656,-8.156 ; 16.095,-3.752 16.57,-3.752 ; 16.095,-3.709 16.57,-3.709 ; 16.095,-3.666 16.527,-3.666 ; 16.138,-8.113 16.699,-8.113 ; 16.138,-3.795 16.613,-3.795 ; 16.181,-3.838 16.613,-3.838 ; 16.224,-3.925 16.656,-3.925 ; 16.224,-3.882 16.656,-3.882 ; 16.268,-8.07 16.743,-8.07 ; 16.268,-4.011 16.699,-4.011 ; 16.268,-3.968 16.699,-3.968 ; 16.311,-8.027 16.829,-8.027 ; 16.311,-4.054 16.699,-4.054 ; 16.354,-7.984 16.829,-7.984 ; 16.354,-4.141 16.743,-4.141 ; 16.354,-4.097 16.743,-4.097 ; 16.397,-7.94 16.829,-7.94 ; 16.397,-4.227 16.786,-4.227 ; 16.397,-4.184 16.786,-4.184 ; 16.44,-7.897 16.915,-7.897 ; 16.44,-4.313 16.829,-4.313 ; 16.44,-4.27 16.829,-4.27 ; 16.483,-7.854 16.958,-7.854 ; 16.483,-4.4 16.872,-4.4 ; 16.483,-4.357 16.872,-4.357 ; 16.527,-7.811 17.045,-7.811 ; 16.527,-4.529 16.915,-4.529 ; 16.527,-4.486 16.915,-4.486 ; 16.527,-4.443 16.872,-4.443 ; 16.57,-7.768 17.045,-7.768 ; 16.57,-4.572 16.915,-4.572 ; 16.613,-7.725 17.088,-7.725 ; 16.613,-4.745 17.002,-4.745 ; 16.613,-4.702 16.958,-4.702 ; 16.613,-4.659 16.958,-4.659 ; 16.613,-4.616 16.958,-4.616 ; 16.656,-7.681 17.433,-7.681 ; 16.656,-4.832 17.002,-4.832 ; 16.656,-4.788 17.002,-4.788 ; 16.656,-3.536 17.995,-3.536 ; 16.699,-7.638 17.477,-7.638 ; 16.699,-5.047 17.045,-5.047 ; 16.699,-5.004 17.045,-5.004 ; 16.699,-4.961 17.045,-4.961 ; 16.699,-4.918 17.045,-4.918 ; 16.699,-4.875 17.045,-4.875 ; 16.699,-3.579 17.995,-3.579 ; 16.743,-7.595 17.477,-7.595 ; 16.743,-5.134 17.045,-5.134 ; 16.743,-5.091 17.045,-5.091 ; 16.743,-3.666 18.038,-3.666 ; 16.743,-3.622 18.038,-3.622 ; 16.786,-7.552 17.52,-7.552 ; 16.786,-7.509 17.563,-7.509 ; 16.786,-5.177 17.045,-5.177 ; 16.786,-3.709 18.038,-3.709 ; 16.829,-7.465 17.606,-7.465 ; 16.829,-6.3 16.958,-6.3 ; 16.829,-6.256 16.958,-6.256 ; 16.829,-5.306 17.045,-5.306 ; 16.829,-5.263 17.045,-5.263 ; 16.829,-5.22 17.045,-5.22 ; 16.829,-3.752 18.081,-3.752 ; 16.872,-7.422 17.649,-7.422 ; 16.872,-6.213 16.958,-6.213 ; 16.872,-6.17 16.958,-6.17 ; 16.872,-6.127 17.002,-6.127 ; 16.872,-6.084 17.002,-6.084 ; 16.872,-6.041 17.002,-6.041 ; 16.872,-5.997 17.002,-5.997 ; 16.872,-5.954 17.002,-5.954 ; 16.872,-5.911 17.045,-5.911 ; 16.872,-5.868 17.045,-5.868 ; 16.872,-5.825 17.045,-5.825 ; 16.872,-5.781 17.045,-5.781 ; 16.872,-5.738 17.045,-5.738 ; 16.872,-5.695 17.045,-5.695 ; 16.872,-5.652 17.045,-5.652 ; 16.872,-5.609 17.045,-5.609 ; 16.872,-5.566 17.045,-5.566 ; 16.872,-5.522 17.045,-5.522 ; 16.872,-5.479 17.045,-5.479 ; 16.872,-5.436 17.045,-5.436 ; 16.872,-5.393 17.045,-5.393 ; 16.872,-5.35 17.045,-5.35 ; 16.872,-3.795 18.124,-3.795 ; 16.915,-8.2 17.088,-8.2 ; 16.915,-8.156 17.088,-8.156 ; 16.915,-8.113 17.131,-8.113 ; 16.915,-7.379 17.649,-7.379 ; 16.915,-4.011 18.124,-4.011 ; 16.915,-3.882 18.124,-3.882 ; 16.915,-3.838 18.124,-3.838 ; 16.958,-8.243 17.045,-8.243 ; 16.958,-8.07 17.174,-8.07 ; 16.958,-7.336 17.693,-7.336 ; 16.958,-7.293 17.736,-7.293 ; 16.958,-4.054 18.124,-4.054 ; 16.958,-3.968 18.124,-3.968 ; 16.958,-3.925 18.124,-3.925 ; 17.002,-8.027 17.218,-8.027 ; 17.002,-7.25 17.736,-7.25 ; 17.002,-4.141 18.168,-4.141 ; 17.002,-4.097 18.168,-4.097 ; 17.045,-7.984 17.261,-7.984 ; 17.045,-7.94 17.261,-7.94 ; 17.045,-7.206 17.779,-7.206 ; 17.045,-7.163 17.779,-7.163 ; 17.088,-7.897 17.261,-7.897 ; 17.088,-7.12 17.779,-7.12 ; 17.088,-7.077 17.779,-7.077 ; 17.088,-4.227 18.168,-4.227 ; 17.088,-4.184 18.168,-4.184 ; 17.131,-7.034 17.822,-7.034 ; 17.131,-4.313 18.168,-4.313 ; 17.131,-4.27 18.168,-4.27 ; 17.174,-7.854 17.304,-7.854 ; 17.174,-6.991 17.865,-6.991 ; 17.174,-6.947 17.865,-6.947 ; 17.174,-6.904 17.865,-6.904 ; 17.174,-4.4 18.211,-4.4 ; 17.174,-4.357 18.211,-4.357 ; 17.218,-7.811 17.347,-7.811 ; 17.218,-7.768 17.347,-7.768 ; 17.218,-7.725 17.39,-7.725 ; 17.218,-6.861 17.908,-6.861 ; 17.218,-6.818 17.908,-6.818 ; 17.218,-4.443 18.211,-4.443 ; 17.261,-6.775 17.952,-6.775 ; 17.261,-6.731 17.952,-6.731 ; 17.261,-5.177 18.211,-5.177 ; 17.261,-5.134 18.211,-5.134 ; 17.261,-5.091 18.211,-5.091 ; 17.261,-5.047 18.254,-5.047 ; 17.261,-4.529 18.254,-4.529 ; 17.261,-4.486 18.254,-4.486 ; 17.304,-6.688 17.995,-6.688 ; 17.304,-6.645 17.995,-6.645 ; 17.304,-6.602 18.038,-6.602 ; 17.304,-6.559 18.038,-6.559 ; 17.304,-5.004 18.254,-5.004 ; 17.304,-4.659 18.254,-4.659 ; 17.304,-4.616 18.254,-4.616 ; 17.304,-4.572 18.254,-4.572 ; 17.347,-6.516 18.038,-6.516 ; 17.347,-6.472 18.038,-6.472 ; 17.347,-6.429 18.038,-6.429 ; 17.347,-5.22 18.211,-5.22 ; 17.347,-4.832 18.297,-4.832 ; 17.347,-4.788 18.297,-4.788 ; 17.347,-4.745 18.254,-4.745 ; 17.347,-4.702 18.254,-4.702 ; 17.39,-6.386 18.038,-6.386 ; 17.39,-6.343 18.081,-6.343 ; 17.39,-6.3 18.081,-6.3 ; 17.39,-6.256 18.081,-6.256 ; 17.39,-4.961 18.297,-4.961 ; 17.39,-4.918 18.297,-4.918 ; 17.39,-4.875 18.297,-4.875 ; 17.433,-6.213 18.081,-6.213 ; 17.433,-6.17 18.124,-6.17 ; 17.433,-6.127 18.124,-6.127 ; 17.433,-6.084 18.124,-6.084 ; 17.433,-6.041 18.124,-6.041 ; 17.433,-5.997 18.124,-5.997 ; 17.477,-5.954 18.168,-5.954 ; 17.477,-5.911 18.168,-5.911 ; 17.477,-5.868 18.168,-5.868 ; 17.477,-5.825 18.168,-5.825 ; 17.477,-5.781 18.168,-5.781 ; 17.477,-5.738 18.168,-5.738 ; 17.477,-5.695 18.168,-5.695 ; 17.477,-5.652 18.168,-5.652 ; 17.477,-5.609 18.168,-5.609 ; 17.477,-5.566 18.168,-5.566 ; 17.477,-5.522 18.168,-5.522 ; 17.477,-5.479 18.168,-5.479 ; 17.477,-5.436 18.168,-5.436 ; 17.477,-5.393 18.211,-5.393 ; 17.477,-5.35 18.211,-5.35 ; 17.477,-5.306 18.211,-5.306 ; 17.477,-5.263 18.211,-5.263
  text "1918-2018" at 6.825,-7.9 h1.78
Bottom Solder:
  drawing of 979 lines, arcs and shapes, not listed
  text "1918-2018" at 6.825,-7.9 h1.78

## JMU_LOGO(1.35cm) [mm]
Bottom Overlay:
  drawing of 2455 lines, arcs and shapes, not listed
  text "1918" at -0.759,-2.891 h1.27

## K60(龙邱底板) [mil]
pads (124):
  oval 59x66 hole 32: 1(-640,-575.68) 2(-640,-475.68) 3(-540,-575.68) 4(-540,-475.68) 5(-440,-575.68) 6(-440,-475.68) 7(-340,-575.68) 8(-340,-475.68) 9(-240,-575.68) 10(-240,-475.68) 11(-140,-575.68) 12(-139.21,-475.68) 13(-40,-575.68) 14(-40,-475.68) 15(60,-575.68) 16(60,-475.68) 17(160,-575.68) 18(156.85,-475.68) 19(260,-575.68) 20(262.36,-475.68) 21(360,-575.68) 22(358.82,-475.68) 23(460,-575.68) 24(457.64,-475.68) 25(560,-575.68) 26(560.39,-475.68) 27(660,-575.68) 28(660,-475.68) 29(760,-575.68) 30(760.39,-475.68) 63(760,924.32) 64(760,824.32) 65(660,924.32) 66(660,824.32) 67(560,926.29) 68(560,824.32) 69(460,924.32) 70(460,824.32) 71(360,924.32) 72(360,824.32) 73(260,924.32) 74(260,824.32) 75(160,924.32) 76(160,824.32) 77(60,924.32) 78(60,824.32) 79(-40,924.32) 80(-40,824.32) 81(-140,924.32) 82(-140,824.32) 83(-240,924.32) 84(-240,824.32) 85(-340,924.32) 86(-340,824.32) 87(-445.12,926.68) 88(-440,824.32) 89(-540,924.32) 90(-540,824.32) 91(-640,924.32) 92(-640,824.32)
  oval 66x59 hole 32: 31(860,-575.68) 32(960,-575.68) 33(860,-475.68) 34(960,-475.68) 35(860,-375.68) 36(960,-375.68) 37(860,-275.68) 38(960,-275.68) 39(860,-174.89) 40(960,-175.68) 41(860,-75.68) 42(960,-75.29) 43(860,24.32) 44(960,24.32) 45(860,124.32) 46(960,124.32) 47(860,224.32) 48(960,224.32) 49(860,324.32) 50(960,324.32) 51(860,424.32) 52(960,424.32) 53(860,524.32) 54(960,524.32) 55(860,624.32) 56(960,624.32) 57(860,724.32) 58(960,724.32) 59(860,824.32) 60(960,824.32) 61(860,924.32) 62(960,924.32) 93(-740,924.32) 94(-840,924.32) 95(-740,824.32) 96(-840,824.32) 97(-740,724.32) 98(-840,718.41) 99(-740,624.32) 100(-840,624.32) 101(-740,524.32) 102(-840,524.32) 103(-740,424.32) 104(-840,424.32) 105(-740,323.92) 106(-840,324.71) 107(-740,224.32) 108(-840,224.32) 109(-740,124.32) 110(-840,124.32) 111(-740,24.32) 112(-840,24.32) 113(-740,-75.68) 114(-840,-75.68) 115(-740,-175.68) 116(-840,-175.68) 117(-740,-275.68) 118(-840,-275.68) 119(-740,-375.68) 120(-840,-375.68) 121(-740,-475.68) 122(-840,-475.68) 123(-740,-575.68) 124(-840,-575.68)
Top Overlay:
  lines w5.91: 800,-155.68 780,-155.68 780,4.32 800,4.32 ; 1020,-335.68 800,-335.68 800,184.32 1020,184.32
  lines w7.87: -641.18,-634.74 -614.02,-662.3 -668.35,-662.3 -640.79,-634.74 ; -900,-635.68 1020,-635.68 1020,984.32 -900,984.32 -900,-635.68

## KF2EDGK5.0-3P [mm]
pads (3):
  rect 2.5x2.5 hole 1.6: 1(0,-0.025)
  round 2.5 hole 1.6: 2(5,-0.025) 3(10,-0.025)
Top Overlay:
  lines w0.254: -2.62,-2.565 -1.985,-2.565 ccw(c-0.08,-1.93) 1.825,-2.565 3.015,-2.565 ccw(c4.92,-1.93) 6.825,-2.565 8.015,-2.565 ccw(c9.92,-1.93) 11.825,-2.565 12.667,-2.565 ; -2.62,3.277 12.7,3.277 ; -2.62,3.531 12.7,3.531 ; -2.62,-4.851 12.7,-4.851 12.7,3.785 -2.62,3.785 -2.62,-4.851
3D body "KF2EDGK5.0-LI.STEP": height 11.25, standoff -2.95, extent 7.46,-4.783 12.54,3.717
3D body "KF2EDGK5.0-LI.STEP": height 11.25, standoff -2.95, extent -2.54,-4.783 2.54,3.717
3D body "KF2EDGK5.0-LI.STEP": height 11.25, standoff -2.95, extent 2.46,-4.783 7.54,3.717

## KF128-2P [mm]
pads (2):
  oval 3x4 hole 1.2: 1(0.134,0.024) 2(5.214,0.024)
Top Overlay:
  lines w0.254: -2.914,2.564 7.754,2.564 ; -2.914,-5.285 -2.914,5.1 7.754,5.1 7.754,-5.285 -2.914,-5.285
  text "V" at 4.706,-4.245 h1.27
  text "V" at -0.347,-4.245 h1.27
3D body "KF128-5.08-.STEP": height 14.15, standoff -3.95, extent -2.914,-5.353 2.666,5.147
3D body "KF128-5.08-.STEP": height 14.15, standoff -3.95, extent 2.166,-5.353 7.746,5.147

## KF128-3P [mm]
pads (3):
  oval 3x4 hole 1.2: 1(0.025,-0.05) 2(5.105,-0.05) 3(10.185,-0.05)
Top Overlay:
  lines w0.254: -3.023,2.49 12.725,2.49 ; -3.023,-5.359 12.725,-5.359 12.725,5.055 -3.023,5.055 -3.023,-5.359
  text "V" at 9.681,-4.545 h1.27
  text "V" at 4.628,-4.545 h1.27
  text "V" at -0.425,-4.545 h1.27
3D body "KF128-5.08-.STEP": height 14.15, standoff -3.95, extent 7.144,-5.434 12.724,5.066
3D body "KF128-5.08-.STEP": height 14.15, standoff -3.95, extent 2.064,-5.434 7.644,5.066
3D body "KF128-5.08-.STEP": height 14.15, standoff -3.95, extent -3.016,-5.434 2.564,5.066

## KF350-2P [mm]
pads (2):
  rect 2.5x2.5 hole 1.5: 1(-0.023,0.102)
  round 2.5 hole 1.5: 2(3.477,0.102)
Top Overlay:
  lines w0.254: -2.36,2.438 5.413,2.438 ; -0.531,-3.378 -0.531,-2.108 0.485,-2.108 0.485,-3.378 ; 2.969,-3.378 2.969,-2.108 3.985,-2.108 3.985,-3.378 ; -2.36,-3.378 -2.36,4.47 5.413,4.47 5.413,-3.378 -2.36,-3.378
Mechanical 15:
  circle w0.05: c1.727,0.102 r0.35
  lines w0.05: 1.227,0.102 2.227,0.102 ; 1.727,-0.398 1.727,0.602
3D body "KF350.STEP": height 10, standoff -3.8, extent 1.327,-3.198 5.227,4.302
3D body "KF350.STEP": height 10, standoff -3.8, extent -2.173,-3.198 1.727,4.302

## KF350-3P [mm]
pads (3):
  rect 2.5x2.5 hole 1.5: 1(0,-0.025)
  round 2.5 hole 1.5: 2(3.5,-0.025) 3(7,-0.025)
Top Overlay:
  lines w0.254: -2.337,2.311 8.941,2.311 ; -0.508,-3.505 -0.508,-2.235 0.508,-2.235 0.508,-3.505 ; 2.992,-3.505 2.992,-2.235 4.008,-2.235 4.008,-3.505 ; 6.492,-3.505 6.492,-2.235 7.508,-2.235 7.508,-3.505 ; -2.337,-3.505 8.941,-3.505 8.941,4.343 -2.337,4.343 -2.337,-3.505
3D body "KF350.STEP": height 10, standoff -3.8, extent -2.147,-3.369 1.753,4.131
3D body "KF350.STEP": height 10, standoff -3.8, extent 1.353,-3.369 5.253,4.131
3D body "KF350.STEP": height 10, standoff -3.8, extent 4.853,-3.369 8.753,4.131

## KF350-18P [mil]
pads (18):
  rect 110x110 hole 59.06: 1(-1.14,8.5)
  round 110 hole 59.06: 2(136.65,8.5) 3(274.45,8.51) 4(412.25,8.51) 5(550.04,8.51) 6(687.84,8.51) 7(825.63,8.5) 8(963.43,8.5) 9(1101.22,8.5) 10(1239.02,8.5) 11(1376.81,8.5) 12(1514.61,8.5) 13(1652.4,8.5) 14(1790.2,8.5) 15(1927.99,8.5) 16(2065.99,8.5) 17(2203.74,8.5) 18(2341.54,8.5)
Top Overlay:
  lines w10: -93.14,100.5 1039.86,100.5 1176.14,100.5 ; -21.14,-128.5 -21.14,-111.5 18.86,-111.5 18.86,-128.5 ; 116.65,-128.5 116.65,-111.5 156.65,-111.5 156.65,-128.5 ; 254.45,-128.49 254.45,-111.5 294.45,-111.5 294.45,-128.49 ; 392.25,-128.49 392.25,-111.5 432.25,-111.5 432.25,-128.49 ; 530.04,-128.49 530.04,-111.5 570.04,-111.5 570.04,-128.49 ; 667.86,-128.5 667.86,-111.5 707.86,-111.5 707.86,-128.5 ; 805.86,-128.5 805.86,-111.5 845.86,-111.5 845.86,-128.5 ; 943.86,-128.5 943.86,-111.5 983.86,-111.5 983.86,-128.5 ; 1081.65,-128.5 1081.65,-111.5 1121.65,-111.5 1121.65,-128.5 ; 1177.65,100.5 1313.94,100.5 ; 1219.45,-128.5 1219.45,-111.5 1259.45,-111.5 1259.45,-128.5 ; 1315.45,100.5 1451.73,100.5 ; 1357.25,-128.5 1357.25,-111.5 1397.25,-111.5 1397.25,-128.5 ; 1453.25,100.5 1589.53,100.5 ; 1495.04,-128.5 1495.04,-111.5 1535.04,-111.5 1535.04,-128.5 ; 1591.04,100.5 1727.32,100.5 ; 1632.84,-128.5 1632.84,-111.5 1672.84,-111.5 1672.84,-128.5 ; 1728.84,100.5 1865.12,100.5 ; 1770.63,-128.5 1770.63,-111.5 1810.63,-111.5 1810.63,-128.5 ; 1866.63,100.5 2002.91,100.5 ; 1908.43,-128.5 1908.43,-111.5 1948.43,-111.5 1948.43,-128.5 ; 1996.63,100.5 2416.34,100.39 ; 2046.43,-128.5 2046.43,-111.5 ; 2047.43,-111.5 2087.43,-111.5 2087.43,-128.5 ; 2181.27,-126.53 2181.27,-109.53 ; 2182.27,-109.53 2222.27,-109.53 2222.27,-126.53 ; 2319.06,-127.51 2319.06,-110.51 ; 2320.06,-110.51 2360.06,-110.51 2360.06,-127.51 ; -93.14,-128.5 -93.14,180.5 1039.86,180.5 1177.65,180.5 1315.45,180.5 1453.25,180.5 1591.04,180.5 1728.84,180.5 1866.63,180.5 2417.32,180.5 2417.32,-128.5 1866.63,-128.5 1728.84,-128.5 1591.04,-128.5 1453.25,-128.5 1315.45,-128.5 1177.65,-128.5 1039.86,-128.5 -93.14,-128.5